# Altium footprint library default_60.PcbLib: 18 footprints (part 1 of 2)
Each footprint in its own frame and in the unit in brackets; x right, y up, seen from the top. Pads: shape width x height; smd on the part's side, far side on the other; paste and mask are expansions set on the pad; w line width, h text height; cw(c..) or ccw(c..) is an arc to the next point about the centre after c.
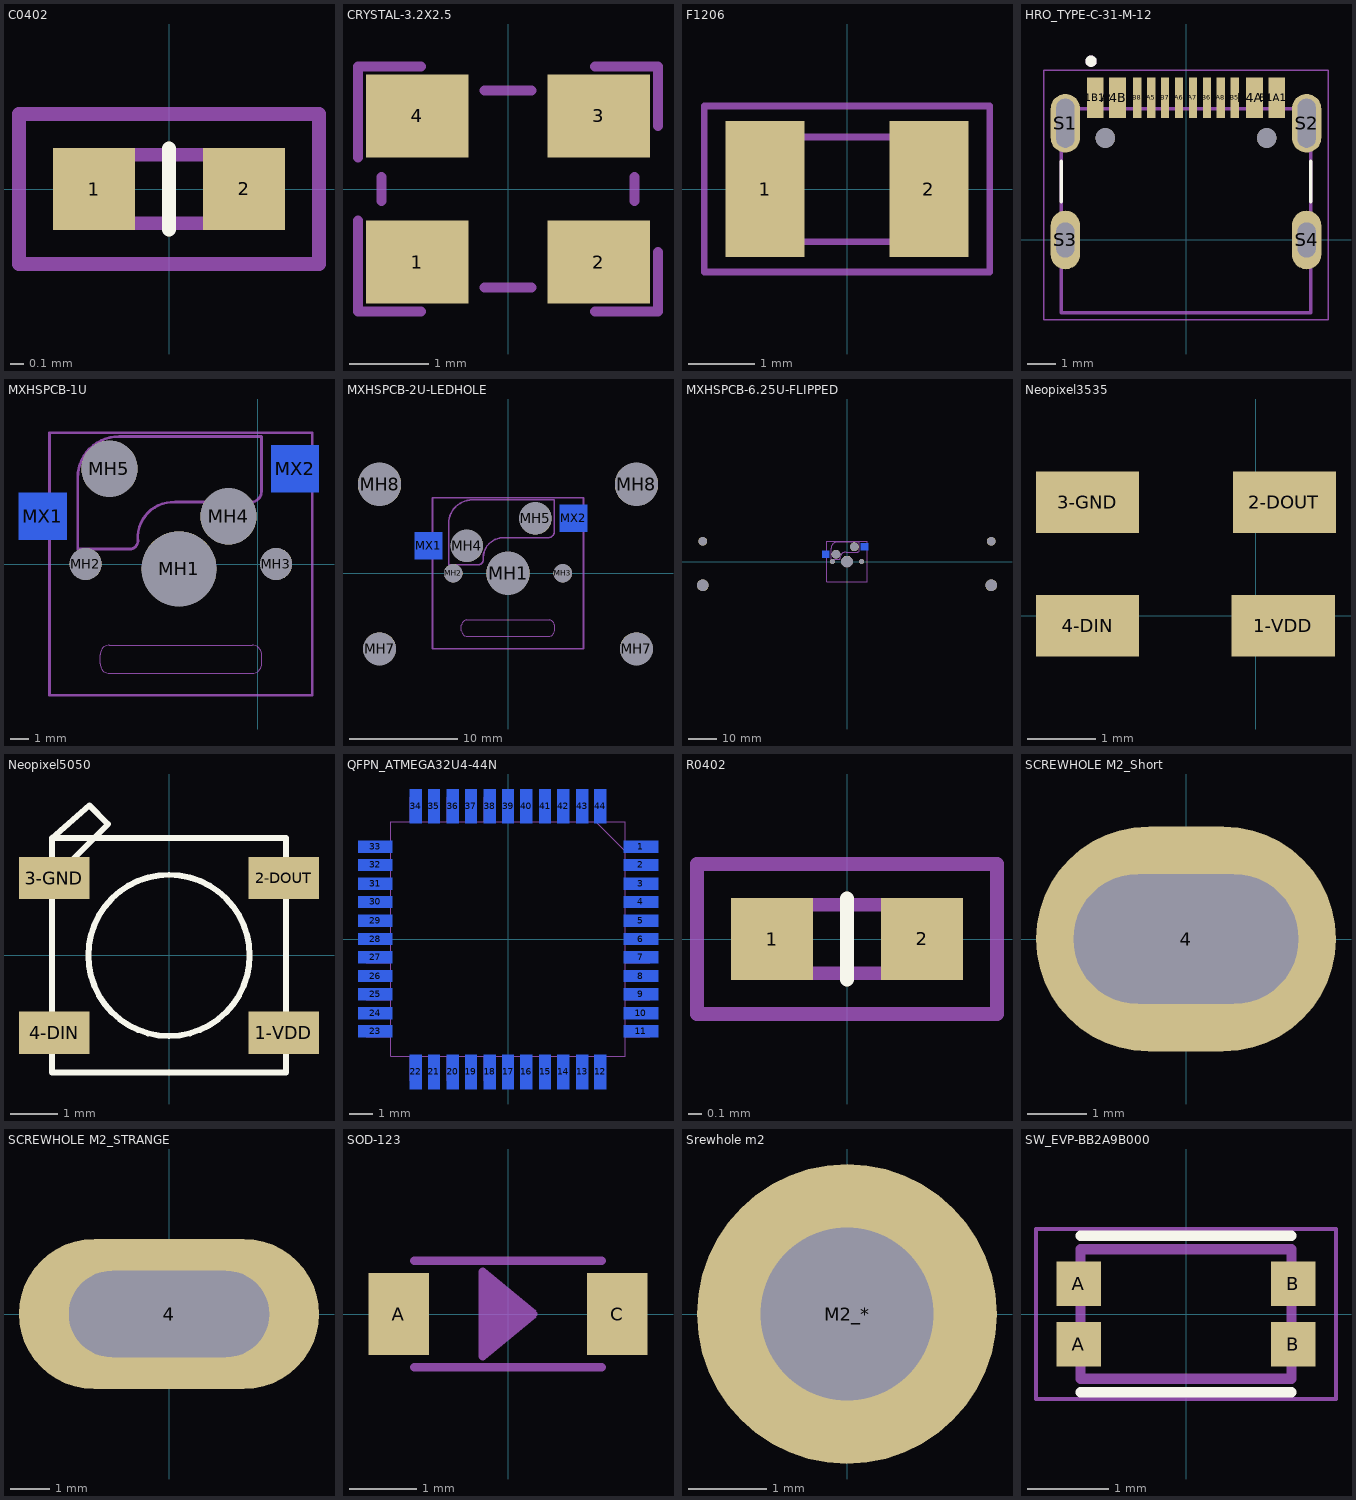
[diagram p0: the footprints below, top view; thin cyan lines are the x and y axes]

## C0402 [mm]
pads (2):
  rect 0.6x0.6 smd: 1(-0.55,0) 2(0.55,0)
Top Overlay:
  lines w0.1: 0,-0.3 0,0.3
Mechanical 1:
  lines w0.1: -0.5,-0.25 -0.5,0.25 0.5,0.25 0.5,-0.25 -0.5,-0.25
  text ".Designator" at -0.5,0.508 h0.8
Mechanical 11:
  lines w0.1: -1.1,-0.55 1.1,-0.55 1.1,0.55 -1.1,0.55 -1.1,-0.55
3D body "User Library-C0402-1.step": height 0.51, standoff 0.01, extent -0.446,-0.25 0.55,0.25

## CRYSTAL-3.2X2.5 [mil]
pads (4):
  rect 51.18x41.34 smd: 1(-45.28,-36.42) 2(45.28,-36.42) 3(45.28,36.42) 4(-45.28,36.42)
Mechanical 7:
  lines w5: -74.8,-15.75 -74.8,-61.02 -43.31,-61.02 ; -74.8,15.75 -74.8,61.02 -43.31,61.02 ; 43.31,-61.02 74.8,-61.02 74.8,-31.5 ; 43.31,61.02 74.8,61.02 74.8,31.5
Mechanical 18:
  lines w5: -62.99,-5.91 -62.99,5.91 ; -11.81,-49.21 11.81,-49.21 ; -11.81,49.21 11.81,49.21 ; 62.99,-5.91 62.99,5.91
3D body "User Library-Crystal_ECX-32.STEP": height 32.28, standoff 0, extent -62.99,-50.2 62.99,48.23

## F1206 [mm]
pads (2):
  rect 1.185x2.05 smd: 1(-1.232,0) 2(1.232,0)
Mechanical 1:
  lines w0.1: -1.588,-0.792 -1.588,0.782 1.588,0.782 1.588,-0.792 -1.588,-0.792
Mechanical 11:
  lines w0.1: -2.15,-1.25 -2.15,1.25 2.15,1.25 2.15,-1.25 -2.15,-1.25
3D body "0458Series.step": height 1.58, standoff 0, extent -1.588,-0.792 1.588,0.782

## HRO_TYPE-C-31-M-12 [mm]
pads (18):
  rect 0.6x1.45 smd: A1B12(-3.25,5.095) A4B9(-2.45,5.095) B1A12(3.25,5.095) B4A9(2.45,5.095)
  rect 0.3x1.45 smd: A5(-1.25,5.095) A6(-0.25,5.095) A7(0.25,5.095) A8(1.25,5.095) B5(1.75,5.095) B6(0.75,5.095) B7(-0.75,5.095) B8(-1.75,5.095)
  oval 1.05x2.1 hole 0.65 slot 1.75 at 90 deg: S1(-4.32,4.18) S2(4.32,4.18)
  oval 1.05x2.1 hole 0.65 slot 1.25 at 90 deg: S3(-4.32,0) S4(4.32,0)
  round 0.7 hole 0.7 unplated: ""(-2.89,3.65) ""(2.89,3.65)
Top Overlay:
  circle w0.2: c-3.4,6.4 r0.1
  lines w0.127: -4.47,1.37 -4.47,2.81 ; 4.47,1.37 4.47,2.81
Mechanical 13:
  circle w0.2: c-3.4,6.4 r0.1
  lines w0.127: -4.47,-2.6 -4.47,4.7 4.47,4.7 4.47,-2.6 -4.47,-2.6
Mechanical 15:
  lines w0.05: -5.095,-2.85 -5.095,6.07 5.095,6.07 5.095,-2.85 -5.095,-2.85
3D body "HRO_TYPE-C-31-M-12.step": height 3.16, standoff -1.04, extent -4.475,-2.54 4.475,5.36

## MXHSPCB-1U [mm]
pads (7):
  round 4 hole 4 unplated: MH1(-4.191,-0.254)
  round 1.7 hole 1.7 unplated: MH2(-9.171,0) MH3(0.989,0)
  round 3 hole 3 unplated: MH4(-1.551,2.54) MH5(-7.901,5.08)
  rect 2.55x2.5 smd far side: MX1(-11.45,2.54) MX2(1.999,5.08)
Dimensions:
  lines w0: -8.401,-5.33 ccw(c-7.901,-5.33) -7.901,-5.83 -0.281,-5.83 ccw(c-0.281,-5.33) 0.22,-5.33 0.22,-4.83 ccw(c-0.281,-4.83) -0.281,-4.33 -7.901,-4.33 ccw(c-7.901,-4.83) -8.401,-4.83 -8.401,-5.33
Mechanical 7:
  lines w0.15: -6.741,0.8 -9.591,0.8 -9.591,4.6 cw(c-7.391,4.6) -7.391,6.8 0.209,6.8 0.209,3.85 cw(c-0.366,3.875) -0.391,3.3 ; -6.741,0.8 ccw(c-6.84,1.25) -6.391,1.35 -6.391,1.5 cw(c-4.491,1.4) -4.391,3.3 -0.391,3.3
Mechanical 18:
  lines w0.15: -11.091,-7 2.909,-7 2.909,7 -11.091,7 -11.091,-7
3D body "Kailh Hotswap MX v22.step": height 1.74, standoff -1.48, extent -11.959,0.749 2.561,6.699
3D body "MX_noled .step": height 15.21, standoff -3.39, extent -11.991,-8.001 3.609,7.599

## MXHSPCB-2U-LEDHOLE [mm]
pads (11):
  round 4 hole 4 unplated: MH1(0,0) MH8(-11.9,8.24) MH8(11.9,8.24)
  round 1.7 hole 1.7 unplated: MH2(-5.08,0) MH3(5.08,0)
  round 3 hole 3 unplated: MH4(-3.81,2.54) MH5(2.54,5.08)
  round 3.05 hole 3.05 unplated: MH7(-11.9,-7) MH7(11.9,-7)
  rect 2.55x2.5 smd far side: MX1(-7.36,2.54) MX2(6.09,5.08)
Dimensions:
  lines w0: -4.31,-5.33 ccw(c-3.81,-5.33) -3.81,-5.83 3.81,-5.83 ccw(c3.81,-5.33) 4.31,-5.33 4.31,-4.83 ccw(c3.81,-4.83) 3.81,-4.33 -3.81,-4.33 ccw(c-3.81,-4.83) -4.31,-4.83 -4.31,-5.33
Mechanical 7:
  lines w0.15: -5.5,0.8 -2.65,0.8 ccw(c-2.75,1.25) -2.3,1.35 -2.3,1.5 cw(c-0.4,1.4) -0.3,3.3 3.7,3.3 ccw(c3.725,3.875) 4.3,3.85 4.3,6.8 -3.3,6.8 ccw(c-3.3,4.6) -5.5,4.6 -5.5,0.8
Mechanical 18:
  lines w0.15: -7,-7 -7,7 7,7 7,-7 -7,-7
3D body "Kailh Hotswap MX v22.step": height 1.74, standoff -1.48, extent -7.768,0.876 6.752,6.826
3D body "MX_noled .step": height 14.91, standoff -3.69, extent -7.874,-7.8 7.726,7.8
3D body "Stabilizer - open.STEP": height 15.21, standoff -3.09, extent -15.333,-8.33 15.367,10.87

## MXHSPCB-6.25U-FLIPPED [mm]
pads (11):
  round 4 hole 4 unplated: MH1(0,0) MH8(-50,-8.24) MH9(50,-8.24)
  round 1.7 hole 1.7 unplated: MH2(-5.08,0) MH3(5.08,0)
  round 3 hole 3 unplated: MH4(-3.81,2.54) MH5(2.54,5.08)
  round 3.05 hole 3.05 unplated: MH6(-50,7) MH7(50,7)
  rect 2.55x2.5 smd far side: MX1(-7.36,2.54) MX2(6.09,5.08)
Mechanical 7:
  lines w0.15: -5.5,0.8 -5.5,4.6 cw(c-3.3,4.6) -3.3,6.8 4.3,6.8 4.3,3.85 cw(c3.725,3.875) 3.7,3.3 -0.3,3.3 ccw(c-0.4,1.4) -2.3,1.5 -2.3,1.35 cw(c-2.75,1.25) -2.65,0.8 -5.5,0.8
Mechanical 18:
  lines w0.15: -7,-7 7,-7 7,7 -7,7 -7,-7
3D body "Kailh Hotswap MX v22.step": height 1.74, standoff -1.48, extent -7.895,0.876 6.625,6.826
3D body "MX_noled .step": height 15.21, standoff -3.39, extent -7.726,-7.673 7.874,7.927

## Neopixel3535 [mm]
pads (4):
  rect 1.5x0.9 smd: 1-VDD(0.4,-0.15) 2-DOUT(0.418,1.65) 3-GND(-2.45,1.65) 4-DIN(-2.45,-0.15)
3D body "SMD WS2812B Mini.step": height 1.96, standoff 0.01, extent -2.715,-0.94 0.965,2.54

## Neopixel5050 [mm]
pads (4):
  rect 1.5x0.9 smd: 1-VDD(2.45,-1.65) 2-DOUT(2.45,1.65) 3-GND(-2.45,1.65) 4-DIN(-2.45,-1.65)
Top Overlay:
  circle w0.127: c0,0 r1.72
  lines w0.127: -2.5,1.6 -1.6,2.5 ; -2.5,1.6 -2.5,2.5 ; -2.5,1.6 -2.5,-2.5 2.5,-2.5 2.5,2.5 -1.6,2.5 ; -2.5,2.5 -1.7,3.2 -1.3,2.8 -1.6,2.5 ; -2.5,2.5 -1.6,2.5
3D body "WS2812_RGB_LED_updated.stp": height 1.71, standoff 0.01, extent -2.6,-2.425 2.75,2.525

## QFPN_ATMEGA32U4-44N [mil]
pads (44):
  rect 58x20 smd far side: 1(226,157) 2(226,126) 3(226,94) 4(226,63) 5(226,31) 6(226,0) 7(226,-31) 8(226,-63) 9(226,-94) 10(226,-126) 11(226,-157) 23(-226,-157) 24(-226,-126) 25(-226,-94) 26(-226,-63) 27(-226,-31) 28(-226,0) 29(-226,31) 30(-226,63) 31(-226,94) 32(-226,126) 33(-226,157)
  rect 20x58 smd far side: 12(157,-226) 13(126,-226) 14(94,-226) 15(63,-226) 16(31,-226) 17(0,-226) 18(-31,-226) 19(-63,-226) 20(-94,-226) 21(-126,-226) 22(-157,-226) 34(-157,226) 35(-126,226) 36(-94,226) 37(-63,226) 38(-31,226) 39(0,226) 40(31,226) 41(63,226) 42(94,226) 43(126,226) 44(157,226)
Bottom Overlay:
  lines w6: -199,-180 -199,-199 -180,-199 ; -199,180 -199,199 -180,199 ; 180,-199 199,-199 199,-180 ; 180,199 199,199 199,180
Mechanical 13:
  drawing of 181 lines, arcs and shapes, not listed
3D body "atmega32u4-au.stp": height 39.87, standoff -3.44, extent -236.22,-237.21 236.22,235.24

## R0402 [mm]
pads (2):
  rect 0.6x0.6 smd: 1(-0.55,0) 2(0.55,0)
Top Overlay:
  lines w0.1: 0,-0.3 0,0.3
Mechanical 1:
  lines w0.1: -0.5,-0.25 -0.5,0.25 0.5,0.25 0.5,-0.25 -0.5,-0.25
  text ".Designator" at -0.5,0.508 h0.8
Mechanical 11:
  lines w0.1: -1.1,-0.55 -1.1,0.55 1.1,0.55 1.1,-0.55 -1.1,-0.55
3D body "User Library-R0402-2.step": height 0.35, standoff 0, extent -0.6,-0.25 0.6,0.25

## SCREWHOLE M2_Short [mil]
pads (1):
  oval 200x150 hole 86.6 slot 150 at 0 deg unplated: 4(0,0)

## SCREWHOLE M2_STRANGE [mil]
pads (1):
  oval 300x150 hole 86.6 slot 200 at 0 deg unplated: 4(0,0)

## SOD-123 [mm]
pads (2):
  rect 0.91x1.22 smd: A(-1.635,0) C(1.635,0)
Mechanical 7:
  lines w0.127: -1.4,-0.8 1.4,-0.8 ; -1.4,0.8 1.4,0.8 ; -0.127,0 -0.127,0.127 ; -0.381,-0.508 -0.381,-0.635 0.381,0 ; -0.381,-0.508 -0.381,-0.381 ; -0.381,-0.508 0.381,0 ; -0.381,-0.508 -0.254,0.508 0.254,0 -0.381,-0.381 ; -0.381,-0.381 -0.381,0.635 0.381,0 ; -0.381,-0.381 -0.254,0.381 0.127,0 -0.254,-0.254 -0.254,-0.127 ; -0.254,-0.127 -0.254,0.254 -0.127,0.127 ; -0.254,-0.127 0,0 -0.127,0.127 ; -0.254,-0.127 -0.127,0.127
  text "K" at 2.5,0 h1.16
3D body "sod123diode.step": height 0.92, standoff -0.53, extent -1.826,-0.938 2.024,0.762

## Srewhole m2 [mil]
pads (1):
  round 150 hole 86.6: M2_*(0,0)

## SW_EVP-BB2A9B000 [mm]
pads (4):
  rect 0.55x0.55 smd paste-1: A(-1.325,-0.375) A(-1.325,0.375) B(1.325,-0.375) B(1.325,0.375)
Top Overlay:
  lines w0.127: -1.3,-0.964 1.3,-0.964 ; -1.3,0.964 1.3,0.964
Top Paste:
  region: 1.55,-0.6 1.1,-0.6 1.1,-0.15 1.55,-0.15
  region: 1.55,0.15 1.1,0.15 1.1,0.6 1.55,0.6
  region: -1.1,-0.6 -1.55,-0.6 -1.55,-0.15 -1.1,-0.15
  region: -1.1,0.15 -1.55,0.15 -1.55,0.6 -1.1,0.6
Mechanical 13:
  lines w0.127: -1.3,-0.8 -1.3,0.8 1.3,0.8 1.3,-0.8 -1.3,-0.8
Mechanical 15:
  lines w0.05: -1.85,-1.05 -1.85,1.05 1.85,1.05 1.85,-1.05 -1.85,-1.05
3D body "User Library-EVPBB2A9B000.step": height 0.54, standoff 0.01, extent -1.5,-0.95 1.5,0.85